# Altium footprint library HARTING THD.PcbLib: 113 footprints (part 4 of 11)
Each footprint in its own frame and in the unit in brackets; x right, y up, seen from the top. Pads: shape width x height; smd on the part's side, far side on the other; paste and mask are expansions set on the pad; w line width, h text height; cw(c..) or ccw(c..) is an arc to the next point about the centre after c.
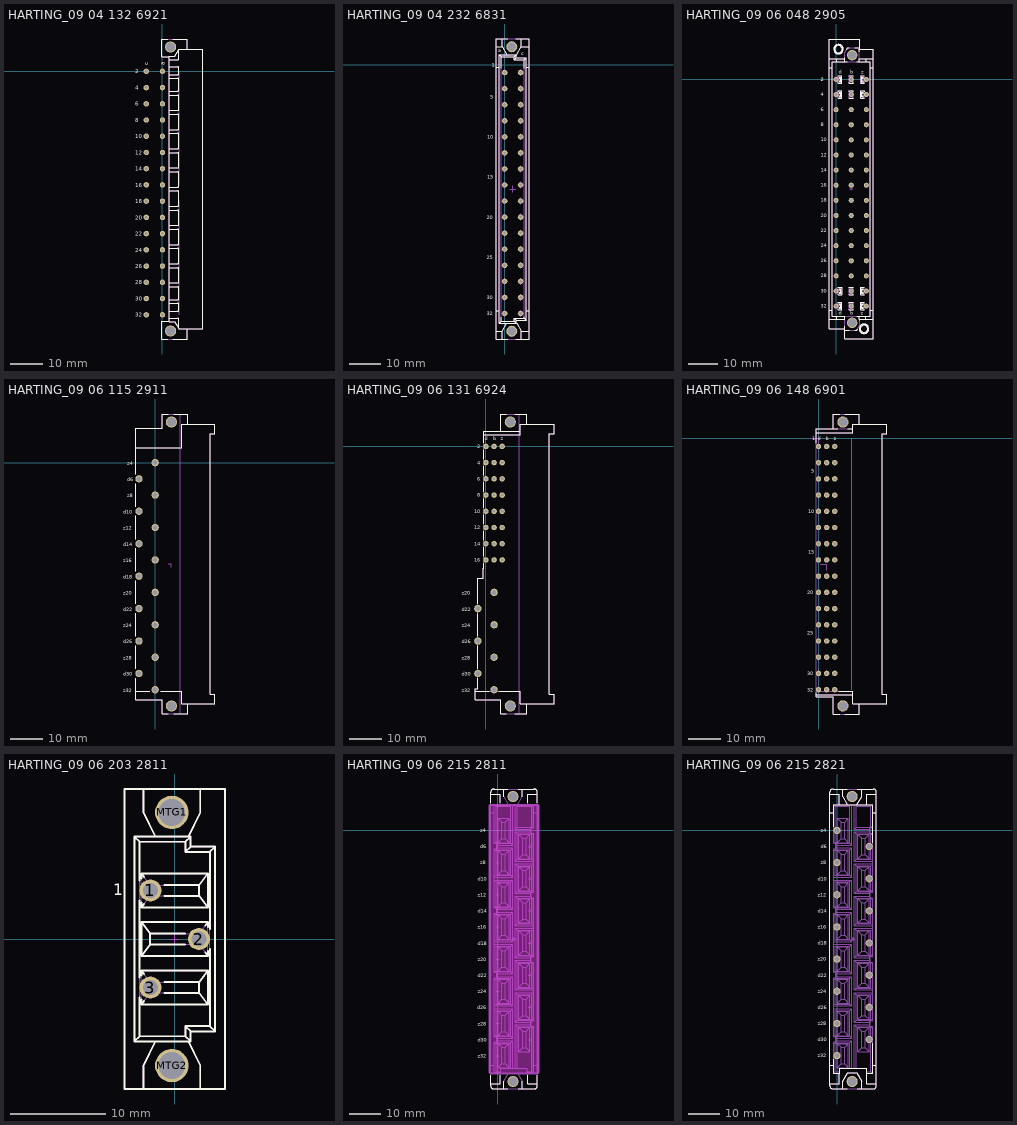
[diagram p3: the footprints below, top view; thin cyan lines are the x and y axes]

## HARTING_09 04 132 6921 [mm] "Eurocard DIN 41612, Type D, 32 Position, Rows a+c, Performance level 2, Male, Lead 3.0 mm, Pitch 5.08 mm"
height 11
pads (34):
  round 1.7 hole 1: a2(0,0) a4(0,-5.08) a6(0,-10.16) a8(0,-15.24) a10(0,-20.32) a12(0,-25.4) a14(0,-30.48) a16(0,-35.56) a18(0,-40.64) a20(0,-45.72) a22(0,-50.8) a24(0,-55.88) a26(0,-60.96) a28(0,-66.04) a30(0,-71.12) a32(0,-76.2) c2(-5.08,0) c4(-5.08,-5.08) c6(-5.08,-10.16) c8(-5.08,-15.24) c10(-5.08,-20.32) c12(-5.08,-25.4) c14(-5.08,-30.48) c16(-5.08,-35.56) c18(-5.08,-40.64) c20(-5.08,-45.72) c22(-5.08,-50.8) c24(-5.08,-55.88) c26(-5.08,-60.96) c28(-5.08,-66.04) c30(-5.08,-71.12) c32(-5.08,-76.2)
  round 3.5 / inner round 3.5 / far side round 5.1 hole 2.8: MTG1(2.54,7.62) MTG2(2.54,-81.28)
Top Overlay:
  lines w0.2: 1.65,-83.78 -0.31,-83.78 -0.31,-78.28 2.04,-78.28 ; 1.65,10.12 -0.31,10.12 -0.31,4.62 2.04,4.62 ; 2.04,-75.05 4.84,-75.05 ccw(c4.84,-74.85) 5.04,-74.85 5.04,-72.83 ccw(c4.84,-72.83) 4.84,-72.63 2.04,-72.63 ; 2.04,-71.43 4.84,-71.43 ccw(c4.84,-71.23) 5.04,-71.23 5.04,-67.63 ccw(c4.84,-67.63) 4.84,-67.43 2.04,-67.43 ; 2.04,-66.23 4.84,-66.23 ccw(c4.84,-66.03) 5.04,-66.03 5.04,-61.63 ccw(c4.84,-61.63) 4.84,-61.43 2.04,-61.43 ; 2.04,-60.23 4.84,-60.23 ccw(c4.84,-60.03) 5.04,-60.03 5.04,-55.63 ccw(c4.84,-55.63) 4.84,-55.43 2.04,-55.43 ; 2.04,-54.23 4.84,-54.23 ccw(c4.84,-54.03) 5.04,-54.03 5.04,-49.63 ccw(c4.84,-49.63) 4.84,-49.43 2.04,-49.43 ; 2.04,-48.23 4.84,-48.23 ccw(c4.84,-48.03) 5.04,-48.03 5.04,-43.63 ccw(c4.84,-43.63) 4.84,-43.43 2.04,-43.43 ; 2.04,-42.23 4.84,-42.23 ccw(c4.84,-42.03) 5.04,-42.03 5.04,-37.63 ccw(c4.84,-37.63) 4.84,-37.43 2.04,-37.43 ; 2.04,-36.23 4.84,-36.23 ccw(c4.84,-36.03) 5.04,-36.03 5.04,-31.63 ccw(c4.84,-31.63) 4.84,-31.43 2.04,-31.43 ; 2.04,-30.23 4.84,-30.23 ccw(c4.84,-30.03) 5.04,-30.03 5.04,-25.63 ccw(c4.84,-25.63) 4.84,-25.43 2.04,-25.43 ; 2.04,-24.23 4.84,-24.23 ccw(c4.84,-24.03) 5.04,-24.03 5.04,-19.63 ccw(c4.84,-19.63) 4.84,-19.43 2.04,-19.43 ; 2.04,-18.23 4.84,-18.23 ccw(c4.84,-18.03) 5.04,-18.03 5.04,-13.63 ccw(c4.84,-13.63) 4.84,-13.43 2.04,-13.43 ; 2.04,-12.23 4.84,-12.23 ccw(c4.84,-12.03) 5.04,-12.03 5.04,-7.63 ccw(c4.84,-7.63) 4.84,-7.43 2.04,-7.43 ; 2.04,-6.23 4.84,-6.23 ccw(c4.84,-6.03) 5.04,-6.03 5.04,-2.43 ccw(c4.84,-2.43) 4.84,-2.23 2.04,-2.23 ; 2.04,-1.03 4.84,-1.03 ccw(c4.84,-0.83) 5.04,-0.83 5.04,1.19 ccw(c4.84,1.19) 4.84,1.39 2.04,1.39 ; 2.04,3.69 4.84,3.69 ccw(c4.84,3.89) 5.04,3.89 5.04,6.75 ; 3.275,-83.78 7.74,-83.78 7.74,-80.53 ; 3.275,10.12 7.74,10.12 7.74,6.87 ; 2.04,-77.35 4.84,-77.35 cw(c4.84,-77.55) 5.04,-77.55 5.04,-80.41 ; 2.04,-77.35 2.04,-77.55 2.04,-78.43 3.897,-78.43 5.04,-80.41 ; 2.04,-77.35 2.04,4.77 3.897,4.77 5.04,6.75 ; 5.04,-80.41 5.109,-80.53 12.64,-80.53 12.64,6.87 5.109,6.87 5.04,6.75
  text "2" at -8.57,-0.675 h1.2
  text "4" at -8.57,-5.755 h1.2
  text "6" at -8.57,-10.835 h1.2
  text "8" at -8.57,-15.915 h1.2
  text "12" at -8.57,-26.075 h1.2
  text "14" at -8.57,-31.155 h1.2
  text "16" at -8.57,-36.235 h1.2
  text "18" at -8.57,-41.315 h1.2
  text "22" at -8.57,-51.475 h1.2
  text "24" at -8.57,-56.555 h1.2
  text "26" at -8.57,-61.635 h1.2
  text "c" at -4.445,1.905 h1.2
  text "a" at 0.635,1.905 h1.2
  text "32" at -8.57,-76.875 h1.2
  text "10" at -8.57,-20.995 h1.2
  text "20" at -8.57,-46.395 h1.2
  text "28" at -8.57,-66.715 h1.2
  text "30" at -8.57,-71.795 h1.2
Mechanical 8:
  lines w0.1: 5.3,-76.2 5.3,-40.475 ; 5.3,-35.725 5.3,0
  text "PCB" at 6.05,-40.1 h1.2
Mechanical 14:
  lines w0.1: 2.04,-78.28 -0.31,-78.28 -0.31,-83.78 7.74,-83.78 7.74,-80.53 ; 2.04,-75.05 4.84,-75.05 ccw(c4.84,-74.85) 5.04,-74.85 5.04,-72.83 ccw(c4.84,-72.83) 4.84,-72.63 2.04,-72.63 ; 2.04,-71.43 4.84,-71.43 ccw(c4.84,-71.23) 5.04,-71.23 5.04,-67.63 ccw(c4.84,-67.63) 4.84,-67.43 2.04,-67.43 ; 2.04,-66.23 4.84,-66.23 ccw(c4.84,-66.03) 5.04,-66.03 5.04,-61.63 ccw(c4.84,-61.63) 4.84,-61.43 2.04,-61.43 ; 2.04,-60.23 4.84,-60.23 ccw(c4.84,-60.03) 5.04,-60.03 5.04,-55.63 ccw(c4.84,-55.63) 4.84,-55.43 2.04,-55.43 ; 2.04,-54.23 4.84,-54.23 ccw(c4.84,-54.03) 5.04,-54.03 5.04,-49.63 ccw(c4.84,-49.63) 4.84,-49.43 2.04,-49.43 ; 2.04,-48.23 4.84,-48.23 ccw(c4.84,-48.03) 5.04,-48.03 5.04,-43.63 ccw(c4.84,-43.63) 4.84,-43.43 2.04,-43.43 ; 2.04,-42.23 4.84,-42.23 ccw(c4.84,-42.03) 5.04,-42.03 5.04,-37.63 ccw(c4.84,-37.63) 4.84,-37.43 2.04,-37.43 ; 2.04,-36.23 4.84,-36.23 ccw(c4.84,-36.03) 5.04,-36.03 5.04,-31.63 ccw(c4.84,-31.63) 4.84,-31.43 2.04,-31.43 ; 2.04,-30.23 4.84,-30.23 ccw(c4.84,-30.03) 5.04,-30.03 5.04,-25.63 ccw(c4.84,-25.63) 4.84,-25.43 2.04,-25.43 ; 2.04,-24.23 4.84,-24.23 ccw(c4.84,-24.03) 5.04,-24.03 5.04,-19.63 ccw(c4.84,-19.63) 4.84,-19.43 2.04,-19.43 ; 2.04,-18.23 4.84,-18.23 ccw(c4.84,-18.03) 5.04,-18.03 5.04,-13.63 ccw(c4.84,-13.63) 4.84,-13.43 2.04,-13.43 ; 2.04,-12.23 4.84,-12.23 ccw(c4.84,-12.03) 5.04,-12.03 5.04,-7.63 ccw(c4.84,-7.63) 4.84,-7.43 2.04,-7.43 ; 2.04,-6.23 4.84,-6.23 ccw(c4.84,-6.03) 5.04,-6.03 5.04,-2.43 ccw(c4.84,-2.43) 4.84,-2.23 2.04,-2.23 ; 2.04,-1.03 4.84,-1.03 ccw(c4.84,-0.83) 5.04,-0.83 5.04,1.19 ccw(c4.84,1.19) 4.84,1.39 2.04,1.39 ; 2.04,3.69 4.84,3.69 ccw(c4.84,3.89) 5.04,3.89 5.04,6.75 ; 2.04,4.62 -0.31,4.62 -0.31,10.12 7.74,10.12 7.74,6.87 ; 2.04,-77.35 2.04,4.77 3.897,4.77 5.04,6.75 ; 2.04,-77.35 2.04,-77.55 2.04,-78.43 3.897,-78.43 5.04,-80.41 ; 2.04,-77.35 4.84,-77.35 cw(c4.84,-77.55) 5.04,-77.55 5.04,-80.41 ; 5.04,-80.41 5.109,-80.53 12.64,-80.53 12.64,6.87 5.109,6.87 5.04,6.75
  text "a" at 0.635,1.905 h1.2
  text "c" at -4.445,1.905 h1.2
  text "30" at -8.57,-71.795 h1.2
  text "28" at -8.57,-66.715 h1.2
  text "20" at -8.57,-46.395 h1.2
  text "10" at -8.57,-20.995 h1.2
  text "32" at -8.57,-76.875 h1.2
  text "26" at -8.57,-61.635 h1.2
  text "24" at -8.57,-56.555 h1.2
  text "22" at -8.57,-51.475 h1.2
  text "18" at -8.57,-41.315 h1.2
  text "16" at -8.57,-36.235 h1.2
  text "14" at -8.57,-31.155 h1.2
  text "12" at -8.57,-26.075 h1.2
  text "8" at -8.57,-15.915 h1.2
  text "6" at -8.57,-10.835 h1.2
  text "4" at -8.57,-5.755 h1.2
  text "2" at -8.57,-0.675 h1.2
3D body "HARTING_09 04 132 6921.stp": height 9.4, standoff -3, extent -5.38,-83.83 12.64,10.17

## HARTING_09 04 232 6831 [mm] "DIN 41612, Type D, Thru-Hole; Rows a+c, 32 Position, Straight Female Backplane Connector"
height 11.6
pads (34):
  round 1.7 hole 1: a2(0,-2.54) a4(0,-7.62) a6(0,-12.7) a8(0,-17.78) a10(0,-22.86) a12(0,-27.94) a14(0,-33.02) a16(0,-38.1) a18(0,-43.18) a20(0,-48.26) a22(0,-53.34) a24(0,-58.42) a26(0,-63.5) a28(0,-68.58) a30(0,-73.66) a32(0,-78.74) c2(5.08,-2.54) c4(5.08,-7.62) c6(5.08,-12.7) c8(5.08,-17.78) c10(5.08,-22.86) c12(5.08,-27.94) c14(5.08,-33.02) c16(5.08,-38.1) c18(5.08,-43.18) c20(5.08,-48.26) c22(5.08,-53.34) c24(5.08,-58.42) c26(5.08,-63.5) c28(5.08,-68.58) c30(5.08,-73.66) c32(5.08,-78.74)
  round 3.5 / inner round 3.5 / far side round 5.1 hole 2.8: MTG1(2.24,5.63) MTG2(2.24,-84.37)
Top Overlay:
  lines w0.2: -2.71,-84.37 -0.735,-84.37 ; -2.71,-77.87 -1.71,-77.87 ; -2.71,-0.87 -1.71,-0.87 ; -2.71,5.63 -0.735,5.63 ; -1.06,-79.95 -1.06,-81.22 ; -1.06,-1.2 -1.06,2.48 ; -0.735,-86.82 -0.735,-84.37 ; -0.735,8.08 -0.735,5.63 ; 1,-86.82 -2.71,-86.82 -2.71,8.08 1,8.08 ; 3.556,-86.82 7.79,-86.82 7.79,8.08 3.556,8.08 ; 5.215,-86.82 5.215,-84.37 ; 5.215,8.08 5.215,5.63 ; 6.14,-79.75 6.14,-80.19 ; 6.14,-1.1 6.14,1.45 ; 6.79,-77.87 7.79,-77.87 ; 6.79,-0.87 7.79,-0.87 ; 7.79,-84.37 5.215,-84.37 ; 7.79,5.63 5.215,5.63 ; -1.71,-81.87 -1.06,-81.22 ; -1.71,-81.87 -1.71,3.13 ; -1.71,-81.87 3.69,-81.87 ; -1.71,3.13 -1.06,2.48 ; -1.71,3.13 3.69,3.13 ; -1.06,-81.22 3.04,-81.22 ; -1.06,2.48 3.04,2.48 ; -0.735,-84.37 0.708,-81.87 3.772,-81.87 5.215,-84.37 ; -0.735,5.63 0.708,3.13 3.772,3.13 5.215,5.63 ; 3.04,-81.22 3.69,-81.87 ; 3.04,-81.22 3.04,-80.19 ; 3.04,-80.19 3.69,-80.84 ; 3.04,-80.19 6.14,-80.19 ; 3.04,1.45 6.14,1.45 ; 3.04,1.45 3.69,2.1 ; 3.04,1.45 3.04,2.48 ; 3.04,2.48 3.69,3.13 ; 3.69,-81.87 3.69,-80.84 ; 3.69,-80.84 6.79,-80.84 ; 3.69,2.1 6.79,2.1 ; 3.69,2.1 3.69,3.13 ; 6.14,-80.19 6.79,-80.84 ; 6.14,1.45 6.79,2.1 ; 6.79,-80.84 6.79,2.1
  text "1" at -4.075,-0.675 h1.2
  text "15" at -5.475,-36.135 h1.2
  text "20" at -5.675,-48.885 h1.2
  text "25" at -5.675,-61.585 h1.2
  text "30" at -5.675,-74.285 h1.2
  text "5" at -4.55,-10.835 h1.2
  text "32" at -5.675,-79.365 h1.2
  text "10" at -5.475,-23.46 h1.2
  text "c" at 5.305,2.935 h1.2
  text "a" at -1.951,3.96 h1.2
Mechanical 8:
  lines w0.1: -1,-78.74 0,-78.74 ; -1,-73.66 0,-73.66 ; -1,-68.58 0,-68.58 ; -1,-63.5 0,-63.5 ; -1,-58.42 0,-58.42 ; -1,-53.34 0,-53.34 ; -1,-48.26 0,-48.26 ; -1,-43.18 0,-43.18 ; -1,-38.1 0,-38.1 ; -1,-33.02 0,-33.02 ; -1,-27.94 0,-27.94 ; -1,-22.86 0,-22.86 ; -1,-17.78 0,-17.78 ; -1,-12.7 0,-12.7 ; -1,-7.62 0,-7.62 ; -1,-2.54 0,-2.54 ; 0,-79.74 0,-78.74 ; 0,-77.74 0,-78.74 ; 0,-74.66 0,-73.66 ; 0,-72.66 0,-73.66 ; 0,-69.58 0,-68.58 ; 0,-67.58 0,-68.58 ; 0,-64.5 0,-63.5 ; 0,-62.5 0,-63.5 ; 0,-59.42 0,-58.42 ; 0,-57.42 0,-58.42 ; 0,-54.34 0,-53.34 ; 0,-52.34 0,-53.34 ; 0,-49.26 0,-48.26 ; 0,-47.26 0,-48.26 ; 0,-44.18 0,-43.18 ; 0,-42.18 0,-43.18 ; 0,-39.1 0,-38.1 ; 0,-37.1 0,-38.1 ; 0,-34.02 0,-33.02 ; 0,-32.02 0,-33.02 ; 0,-28.94 0,-27.94 ; 0,-26.94 0,-27.94 ; 0,-23.86 0,-22.86 ; 0,-21.86 0,-22.86 ; 0,-18.78 0,-17.78 ; 0,-16.78 0,-17.78 ; 0,-13.7 0,-12.7 ; 0,-11.7 0,-12.7 ; 0,-8.62 0,-7.62 ; 0,-6.62 0,-7.62 ; 0,-3.54 0,-2.54 ; 0,-1.54 0,-2.54 ; 1,-78.74 0,-78.74 ; 1,-73.66 0,-73.66 ; 1,-68.58 0,-68.58 ; 1,-63.5 0,-63.5 ; 1,-58.42 0,-58.42 ; 1,-53.34 0,-53.34 ; 1,-48.26 0,-48.26 ; 1,-43.18 0,-43.18 ; 1,-38.1 0,-38.1 ; 1,-33.02 0,-33.02 ; 1,-27.94 0,-27.94 ; 1,-22.86 0,-22.86 ; 1,-17.78 0,-17.78 ; 1,-12.7 0,-12.7 ; 1,-7.62 0,-7.62 ; 1,-2.54 0,-2.54 ; 1.24,-84.37 2.24,-84.37 ; 1.24,5.63 2.24,5.63 ; 1.54,-39.37 2.54,-39.37 ; 2.24,-85.37 2.24,-84.37 ; 2.24,-83.37 2.24,-84.37 ; 2.24,4.63 2.24,5.63 ; 2.24,6.63 2.24,5.63 ; 2.54,-40.37 2.54,-39.37 ; 2.54,-38.37 2.54,-39.37 ; 3.24,-84.37 2.24,-84.37 ; 3.24,5.63 2.24,5.63 ; 3.54,-39.37 2.54,-39.37 ; 4.08,-78.74 5.08,-78.74 ; 4.08,-73.66 5.08,-73.66 ; 4.08,-68.58 5.08,-68.58 ; 4.08,-63.5 5.08,-63.5 ; 4.08,-58.42 5.08,-58.42 ; 4.08,-53.34 5.08,-53.34 ; 4.08,-48.26 5.08,-48.26 ; 4.08,-43.18 5.08,-43.18 ; 4.08,-38.1 5.08,-38.1 ; 4.08,-33.02 5.08,-33.02 ; 4.08,-27.94 5.08,-27.94 ; 4.08,-22.86 5.08,-22.86 ; 4.08,-17.78 5.08,-17.78 ; 4.08,-12.7 5.08,-12.7 ; 4.08,-7.62 5.08,-7.62 ; 4.08,-2.54 5.08,-2.54 ; 5.08,-79.74 5.08,-78.74 ; 5.08,-77.74 5.08,-78.74 ; 5.08,-74.66 5.08,-73.66 ; 5.08,-72.66 5.08,-73.66 ; 5.08,-69.58 5.08,-68.58 ; 5.08,-67.58 5.08,-68.58 ; 5.08,-64.5 5.08,-63.5 ; 5.08,-62.5 5.08,-63.5 ; 5.08,-59.42 5.08,-58.42 ; 5.08,-57.42 5.08,-58.42 ; 5.08,-54.34 5.08,-53.34 ; 5.08,-52.34 5.08,-53.34 ; 5.08,-49.26 5.08,-48.26 ; 5.08,-47.26 5.08,-48.26 ; 5.08,-44.18 5.08,-43.18 ; 5.08,-42.18 5.08,-43.18 ; 5.08,-39.1 5.08,-38.1 ; 5.08,-37.1 5.08,-38.1 ; 5.08,-34.02 5.08,-33.02 ; 5.08,-32.02 5.08,-33.02 ; 5.08,-28.94 5.08,-27.94 ; 5.08,-26.94 5.08,-27.94 ; 5.08,-23.86 5.08,-22.86 ; 5.08,-21.86 5.08,-22.86 ; 5.08,-18.78 5.08,-17.78 ; 5.08,-16.78 5.08,-17.78 ; 5.08,-13.7 5.08,-12.7 ; 5.08,-11.7 5.08,-12.7 ; 5.08,-8.62 5.08,-7.62 ; 5.08,-6.62 5.08,-7.62 ; 5.08,-3.54 5.08,-2.54 ; 5.08,-1.54 5.08,-2.54 ; 6.08,-78.74 5.08,-78.74 ; 6.08,-73.66 5.08,-73.66 ; 6.08,-68.58 5.08,-68.58 ; 6.08,-63.5 5.08,-63.5 ; 6.08,-58.42 5.08,-58.42 ; 6.08,-53.34 5.08,-53.34 ; 6.08,-48.26 5.08,-48.26 ; 6.08,-43.18 5.08,-43.18 ; 6.08,-38.1 5.08,-38.1 ; 6.08,-33.02 5.08,-33.02 ; 6.08,-27.94 5.08,-27.94 ; 6.08,-22.86 5.08,-22.86 ; 6.08,-17.78 5.08,-17.78 ; 6.08,-12.7 5.08,-12.7 ; 6.08,-7.62 5.08,-7.62 ; 6.08,-2.54 5.08,-2.54
Mechanical 14:
  circle w0.1: c2.24,-84.37 r1.425
  circle w0.1: c2.24,5.63 r1.425
  lines w0.1: -2.71,-84.37 -0.735,-84.37 ; -2.71,-77.87 -1.71,-77.87 ; -2.71,-0.87 -1.71,-0.87 ; -0.735,-86.82 -0.735,-84.37 ; -0.735,8.08 -0.735,5.63 0.708,3.13 3.772,3.13 5.215,5.63 ; -0.3,2.925 1.675,2.925 ; 5.215,-86.82 5.215,-84.37 ; 5.215,8.08 5.215,5.63 ; 6.79,-77.87 7.79,-77.87 ; 6.79,-0.87 7.79,-0.87 ; 7.79,-84.37 5.215,-84.37 ; 7.79,5.63 5.215,5.63 ; -1.71,-81.87 -1.06,-81.22 ; -1.71,-81.87 -1.71,3.13 ; -1.71,-81.87 3.69,-81.87 ; -1.71,3.13 -1.06,2.48 ; -1.71,3.13 3.69,3.13 ; -1.06,-81.22 -1.06,2.48 ; -1.06,-81.22 3.04,-81.22 ; -1.06,2.48 3.04,2.48 ; -0.735,-84.37 0.708,-81.87 3.772,-81.87 5.215,-84.37 ; 3.04,-81.22 3.69,-81.87 ; 3.04,-81.22 3.04,-80.19 ; 3.04,-80.19 3.69,-80.84 ; 3.04,-80.19 6.14,-80.19 ; 3.04,1.45 6.14,1.45 ; 3.04,1.45 3.69,2.1 ; 3.04,1.45 3.04,2.48 ; 3.04,2.48 3.69,3.13 ; 3.69,-81.87 3.69,-80.84 ; 3.69,-80.84 6.79,-80.84 ; 3.69,2.1 6.79,2.1 ; 3.69,2.1 3.69,3.13 ; 6.14,-80.19 6.79,-80.84 ; 6.14,-80.19 6.14,1.45 ; 6.14,1.45 6.79,2.1 ; 6.79,-80.84 6.79,2.1 ; -2.71,-86.82 -2.71,8.08 7.79,8.08 7.79,-86.82 -2.71,-86.82
  text "1" at -4.075,-0.675 h1.2
  text "15" at -5.475,-36.135 h1.2
  text "20" at -5.675,-48.885 h1.2
  text "25" at -5.675,-61.585 h1.2
  text "30" at -5.675,-74.285 h1.2
  text "5" at -4.55,-10.835 h1.2
  text "32" at -5.675,-79.365 h1.2
  text "10" at -5.475,-23.46 h1.2
  text "c" at 5.305,2.935 h1.2
  text "a" at -1.951,3.96 h1.2
3D body "HARTING_09 04 232 6831.stp": height 11.6, standoff -4.5, extent -2.71,-86.82 7.79,8.08

## HARTING_09 06 048 2905 [mm] "DIN 41612, Type F. 48 Contacts, Rows z+b+d, Performance Level 1, Straight Male Connector"
height 18
pads (50):
  round 1.7 hole 1: b2(5.08,0) b4(5.08,-5.08) b6(5.08,-10.16) b8(5.08,-15.24) b10(5.08,-20.32) b12(5.08,-25.4) b14(5.08,-30.48) b16(5.08,-35.56) b18(5.08,-40.64) b20(5.08,-45.72) b22(5.08,-50.8) b24(5.08,-55.88) b26(5.08,-60.96) b28(5.08,-66.04) b30(5.08,-71.12) b32(5.08,-76.2) d2(0,0) d4(0,-5.08) d6(0,-10.16) d8(0,-15.24) d10(0,-20.32) d12(0,-25.4) d14(0,-30.48) d16(0,-35.56) d18(0,-40.64) d20(0,-45.72) d22(0,-50.8) d24(0,-55.88) d26(0,-60.96) d28(0,-66.04) d30(0,-71.12) d32(0,-76.2) z2(10.16,0) z4(10.16,-5.08) z6(10.16,-10.16) z8(10.16,-15.24) z10(10.16,-20.32) z12(10.16,-25.4) z14(10.16,-30.48) z16(10.16,-35.56) z18(10.16,-40.64) z20(10.16,-45.72) z22(10.16,-50.8) z24(10.16,-55.88) z26(10.16,-60.96) z28(10.16,-66.04) z30(10.16,-71.12) z32(10.16,-76.2)
  round 3.5 / inner round 3.5 / far side round 5.1 hole 2.8: MTG1(5.38,-81.83) MTG1(5.38,8.17)
Top Overlay:
  drawing of 172 lines, arcs and shapes, not listed
  text "d" at 0.952,1.905 h1.2
  text "z" at 8.417,1.905 h1.2
  text "b" at 4.763,1.905 h1.2
  text "2" at -5.125,-0.525 h1.2
  text "2" at -5.125,-0.525 h1.2
  text "4" at -5.125,-5.605 h1.2
  text "6" at -5.125,-10.685 h1.2
  text "8" at -5.125,-15.765 h1.2
  text "10" at -5.125,-20.845 h1.2
  text "12" at -5.125,-25.925 h1.2
  text "14" at -5.125,-31.005 h1.2
  text "16" at -5.125,-36.085 h1.2
  text "18" at -5.125,-41.165 h1.2
  text "20" at -5.125,-46.245 h1.2
  text "22" at -5.125,-51.325 h1.2
  text "24" at -5.125,-56.405 h1.2
  text "26" at -5.125,-61.485 h1.2
  text "28" at -5.125,-66.565 h1.2
  text "30" at -5.125,-71.645 h1.2
  text "32" at -5.125,-76.725 h1.2
  text "b" at 4.7,-79.1 h1.2
  text "z" at 8.355,-79.1 h1.2
  text "d" at 0.89,-79.1 h1.2
Mechanical 8:
  drawing of 254 lines, arcs and shapes, not listed
Mechanical 14:
  drawing of 232 lines, arcs and shapes, not listed
  text "d" at 0.952,1.905 h1.2
  text "z" at 8.417,1.905 h1.2
  text "b" at 4.763,1.905 h1.2
  text "2" at -5.125,-0.525 h1.2
  text "2" at -5.125,-0.525 h1.2
  text "4" at -5.125,-5.605 h1.2
  text "6" at -5.125,-10.685 h1.2
  text "8" at -5.125,-15.765 h1.2
  text "10" at -5.125,-20.845 h1.2
  text "12" at -5.125,-25.925 h1.2
  text "14" at -5.125,-31.005 h1.2
  text "16" at -5.125,-36.085 h1.2
  text "18" at -5.125,-41.165 h1.2
  text "20" at -5.125,-46.245 h1.2
  text "22" at -5.125,-51.325 h1.2
  text "24" at -5.125,-56.405 h1.2
  text "26" at -5.125,-61.485 h1.2
  text "28" at -5.125,-66.565 h1.2
  text "30" at -5.125,-71.645 h1.2
  text "32" at -5.125,-76.725 h1.2
  text "b" at 4.7,-79.1 h1.2
  text "z" at 8.355,-79.1 h1.2
  text "d" at 0.89,-79.1 h1.2
3D body "HARTING_09 06 048 2905.stp": height 18, standoff -3.7, extent -2.27,-87.255 12.43,13.595

## HARTING_09 06 115 2911 [mm] "DIN 41612, Type H, 15 Poles, Rows z+d, Performance level 1, Right Angle Male Connector, Lead 3.0 mm, Pitch 5.08mm"
height 11
pads (17):
  round 2.3 hole 1.6: d6(-5.08,-5.08) d10(-5.08,-15.24) d14(-5.08,-25.4) d18(-5.08,-35.56) d22(-5.08,-45.72) d26(-5.08,-55.88) d30(-5.08,-66.04) z4(0,0) z8(0,-10.16) z12(0,-20.32) z16(0,-30.48) z20(0,-40.64) z24(0,-50.8) z28(0,-60.96) z32(0,-71.12)
  round 3.5 / inner round 3.5 / far side round 5.1 hole 2.8: MTG1(5.08,12.7) MTG2(5.08,-76.2)
Top Overlay:
  lines w0.2: -6.02,-71.55 -1.696,-71.55 ; -6.02,-67.516 -6.02,-74.3 2.18,-74.3 2.18,-78.725 4.14,-78.725 ; -6.02,-64.564 -6.02,-57.356 ; -6.02,-54.404 -6.02,-47.196 ; -6.02,-44.244 -6.02,-37.036 ; -6.02,-34.084 -6.02,-26.876 ; -6.02,-23.924 -6.02,-16.716 ; -6.02,-13.764 -6.02,-6.556 ; -6.02,-3.604 -6.02,10.8 2.18,10.8 2.18,15.225 4.14,15.225 ; -6.02,4.67 8.38,4.67 8.38,11.95 18.73,11.95 18.73,9.05 17.21,9.05 17.21,-72.55 18.73,-72.55 18.73,-75.45 8.38,-75.45 8.38,-71.55 1.696,-71.55 ; 5.765,-78.725 10.23,-78.725 10.23,-75.45 ; 5.765,15.225 10.23,15.225 10.23,11.95
  text "z32" at -10.07,-71.87 h1.2
  text "z28" at -10.07,-61.71 h1.2
  text "d30" at -10.07,-66.79 h1.2
  text "z24" at -10.07,-51.55 h1.2
  text "d26" at -10.07,-56.63 h1.2
  text "z20" at -10.07,-41.39 h1.2
  text "d22" at -10.07,-46.47 h1.2
  text "z16" at -10.07,-31.23 h1.2
  text "d18" at -10.07,-36.31 h1.2
  text "z12" at -10.07,-21.07 h1.2
  text "d14" at -10.07,-26.15 h1.2
  text "z8" at -8.8,-10.91 h1.2
  text "d10" at -10.07,-15.99 h1.2
  text "d6" at -8.8,-5.83 h1.2
  text "z4" at -8.8,-0.75 h1.2
Mechanical 8:
  lines w0.2: 4.064,-31.75 5.08,-31.75 5.08,-32.75 ; 7.84,-78.725 7.84,15.225
  text "PCB" at 6.985,-33.655 h1.2
Mechanical 14:
  lines w0.1: -6.02,-71.55 -1.696,-71.55 ; -6.02,-67.516 -6.02,-74.3 2.18,-74.3 2.18,-78.725 10.23,-78.725 10.23,-75.45 ; -6.02,-64.564 -6.02,-57.356 ; -6.02,-54.404 -6.02,-47.196 ; -6.02,-44.244 -6.02,-37.036 ; -6.02,-34.084 -6.02,-26.876 ; -6.02,-23.924 -6.02,-16.716 ; -6.02,-13.764 -6.02,-6.556 ; -6.02,-3.604 -6.02,10.8 2.18,10.8 2.18,15.225 10.23,15.225 10.23,11.95 ; -6.02,4.67 8.38,4.67 8.38,11.95 18.73,11.95 18.73,9.05 17.21,9.05 17.21,-72.55 18.73,-72.55 18.73,-75.45 8.38,-75.45 8.38,-71.55 1.696,-71.55
  text "z32" at -10.07,-71.87 h1.2
  text "z28" at -10.07,-61.71 h1.2
  text "d30" at -10.07,-66.79 h1.2
  text "z24" at -10.07,-51.55 h1.2
  text "d26" at -10.07,-56.63 h1.2
  text "z20" at -10.07,-41.39 h1.2
  text "d22" at -10.07,-46.47 h1.2
  text "z16" at -10.07,-31.23 h1.2
  text "d18" at -10.07,-36.31 h1.2
  text "z12" at -10.07,-21.07 h1.2
  text "d14" at -10.07,-26.15 h1.2
  text "z8" at -8.8,-10.91 h1.2
  text "d10" at -10.07,-15.99 h1.2
  text "d6" at -8.8,-5.83 h1.2
  text "z4" at -8.8,-0.75 h1.2
3D body "HARTING_09 06 115 2911.stp": height 11.2, standoff -3.5, extent -6.02,-78.725 18.73,15.225

## HARTING_09 06 131 6924 [mm] "DIN 41612, Type MH, 24+ 7 Contacts, Rows z+b+d, Performance level 2, Right Angled Male Connector"
height 11.22
pads (33):
  round 1.7 hole 1: b2(2.54,0) b4(2.54,-5.08) b6(2.54,-10.16) b8(2.54,-15.24) b10(2.54,-20.32) b12(2.54,-25.4) b14(2.54,-30.48) b16(2.54,-35.56) d2(0,0) d4(0,-5.08) d6(0,-10.16) d8(0,-15.24) d10(0,-20.32) d12(0,-25.4) d14(0,-30.48) d16(0,-35.56) z2(5.08,0) z4(5.08,-5.08) z6(5.08,-10.16) z8(5.08,-15.24) z10(5.08,-20.32) z12(5.08,-25.4) z14(5.08,-30.48) z16(5.08,-35.56)
  round 2.3 hole 1.6: d22(-2.54,-50.8) d26(-2.54,-60.96) d30(-2.54,-71.12) z20(2.54,-45.72) z24(2.54,-55.88) z28(2.54,-66.04) z32(2.54,-76.2)
  round 3.5 / inner round 3.5 / far side round 5.1 hole 2.8: MTG1(7.62,7.62) MTG2(7.62,-81.28)
Top Overlay:
  lines w0.2: -3.43,-76.63 1.051,-76.63 ; -2.63,-72.667 -2.63,-75.83 -3.43,-75.83 -3.43,-79.36 4.67,-79.36 4.67,-83.805 6.325,-83.805 ; -2.63,-69.573 -2.63,-62.507 ; -2.63,-59.413 -2.63,-52.347 ; -2.63,-49.253 -2.63,-41.345 -0.83,-41.345 -0.83,-38.1 -0.68,-38.1 -0.68,-36.668 ; -0.68,-34.452 -0.68,-31.588 ; -0.68,-29.372 -0.68,-26.508 ; -0.68,-24.292 -0.68,-21.428 ; -0.68,-19.212 -0.68,-16.348 ; -0.68,-14.132 -0.68,-11.268 ; -0.68,-9.052 -0.68,-6.188 ; -0.68,-3.972 -0.68,-1.108 ; -0.68,1.108 -0.68,4.79 10.77,4.79 ; -0.68,3.62 10.77,3.62 10.77,6.87 21.32,6.87 21.32,3.97 19.82,3.97 19.82,-77.63 21.32,-77.63 21.32,-80.53 10.77,-80.53 ; 4.029,-76.63 10.77,-76.63 ; 4.67,4.79 4.67,10.145 6.325,10.145 ; 9.025,-83.805 12.77,-83.805 12.77,-80.53 ; 9.025,10.145 12.77,10.145 12.77,6.87 ; 10.77,-80.53 10.77,-76.63 ; 10.77,-80.53 10.77,-76.63
  text "d22" at -7.53,-51.55 h1.2
  text "z20" at -7.53,-46.47 h1.2
  text "d26" at -7.53,-61.71 h1.2
  text "z24" at -7.53,-56.63 h1.2
  text "d30" at -7.53,-71.87 h1.2
  text "z28" at -7.53,-66.79 h1.2
  text "z32" at -7.53,-76.95 h1.2
  text "b" at 2.223,1.905 h1.2
  text "2" at -2.765,-0.543 h1.2
  text "4" at -2.79,-5.685 h1.2
  text "z" at 4.608,1.905 h1.2
  text "d" at -0.318,1.905 h1.2
  text "6" at -2.79,-10.765 h1.2
  text "8" at -2.79,-15.845 h1.2
  text "10" at -3.74,-20.925 h1.2
  text "12" at -3.74,-26.005 h1.2
  text "14" at -3.74,-31.085 h1.2
  text "16" at -3.74,-36.165 h1.2
Mechanical 8:
  lines w0.1: -3.04,-71.12 -2.54,-71.12 ; -3.04,-60.96 -2.54,-60.96 ; -3.04,-50.8 -2.54,-50.8 ; -2.54,-71.62 -2.54,-71.12 ; -2.54,-70.62 -2.54,-71.12 ; -2.54,-61.46 -2.54,-60.96 ; -2.54,-60.46 -2.54,-60.96 ; -2.54,-51.3 -2.54,-50.8 ; -2.54,-50.3 -2.54,-50.8 ; -2.04,-71.12 -2.54,-71.12 ; -2.04,-60.96 -2.54,-60.96 ; -2.04,-50.8 -2.54,-50.8 ; -0.5,-35.56 0,-35.56 ; -0.5,-30.48 0,-30.48 ; -0.5,-25.4 0,-25.4 ; -0.5,-20.32 0,-20.32 ; -0.5,-15.24 0,-15.24 ; -0.5,-10.16 0,-10.16 ; -0.5,-5.08 0,-5.08 ; 0,-36.06 0,-35.56 ; 0,-35.06 0,-35.56 ; 0,-30.98 0,-30.48 ; 0,-29.98 0,-30.48 ; 0,-25.9 0,-25.4 ; 0,-24.9 0,-25.4 ; 0,-20.82 0,-20.32 ; 0,-19.82 0,-20.32 ; 0,-15.74 0,-15.24 ; 0,-14.74 0,-15.24 ; 0,-10.66 0,-10.16 ; 0,-9.66 0,-10.16 ; 0,-5.58 0,-5.08 ; 0,-4.58 0,-5.08 ; 0.5,-35.56 0,-35.56 ; 0.5,-30.48 0,-30.48 ; 0.5,-25.4 0,-25.4 ; 0.5,-20.32 0,-20.32 ; 0.5,-15.24 0,-15.24 ; 0.5,-10.16 0,-10.16 ; 0.5,-5.08 0,-5.08 ; 2.04,-76.2 2.54,-76.2 ; 2.04,-66.04 2.54,-66.04 ; 2.04,-55.88 2.54,-55.88 ; 2.04,-45.72 2.54,-45.72 ; 2.04,-35.56 2.54,-35.56 ; 2.04,-30.48 2.54,-30.48 ; 2.04,-25.4 2.54,-25.4 ; 2.04,-20.32 2.54,-20.32 ; 2.04,-15.24 2.54,-15.24 ; 2.04,-10.16 2.54,-10.16 ; 2.04,-5.08 2.54,-5.08 ; 2.04,0 2.54,0 ; 2.54,-76.7 2.54,-76.2 ; 2.54,-75.7 2.54,-76.2 ; 2.54,-66.54 2.54,-66.04 ; 2.54,-65.54 2.54,-66.04 ; 2.54,-56.38 2.54,-55.88 ; 2.54,-55.38 2.54,-55.88 ; 2.54,-46.22 2.54,-45.72 ; 2.54,-45.22 2.54,-45.72 ; 2.54,-36.06 2.54,-35.56 ; 2.54,-35.06 2.54,-35.56 ; 2.54,-30.98 2.54,-30.48 ; 2.54,-29.98 2.54,-30.48 ; 2.54,-25.9 2.54,-25.4 ; 2.54,-24.9 2.54,-25.4 ; 2.54,-20.82 2.54,-20.32 ; 2.54,-19.82 2.54,-20.32 ; 2.54,-15.74 2.54,-15.24 ; 2.54,-14.74 2.54,-15.24 ; 2.54,-10.66 2.54,-10.16 ; 2.54,-9.66 2.54,-10.16 ; 2.54,-5.58 2.54,-5.08 ; 2.54,-4.58 2.54,-5.08 ; 2.54,-0.5 2.54,0 ; 2.54,0.5 2.54,0 ; 3.04,-76.2 2.54,-76.2 ; 3.04,-66.04 2.54,-66.04 ; 3.04,-55.88 2.54,-55.88 ; 3.04,-45.72 2.54,-45.72 ; 3.04,-35.56 2.54,-35.56 ; 3.04,-30.48 2.54,-30.48 ; 3.04,-25.4 2.54,-25.4 ; 3.04,-20.32 2.54,-20.32 ; 3.04,-15.24 2.54,-15.24 ; 3.04,-10.16 2.54,-10.16 ; 3.04,-5.08 2.54,-5.08 ; 3.04,0 2.54,0 ; 4.58,-35.56 5.08,-35.56 ; 4.58,-30.48 5.08,-30.48 ; 4.58,-25.4 5.08,-25.4 ; 4.58,-20.32 5.08,-20.32 ; 4.58,-15.24 5.08,-15.24 ; 4.58,-10.16 5.08,-10.16 ; 4.58,-5.08 5.08,-5.08 ; 4.58,0 5.08,0 ; 5.08,-36.06 5.08,-35.56 ; 5.08,-35.06 5.08,-35.56 ; 5.08,-30.98 5.08,-30.48 ; 5.08,-29.98 5.08,-30.48 ; 5.08,-25.9 5.08,-25.4 ; 5.08,-24.9 5.08,-25.4 ; 5.08,-20.82 5.08,-20.32 ; 5.08,-19.82 5.08,-20.32 ; 5.08,-15.74 5.08,-15.24 ; 5.08,-14.74 5.08,-15.24 ; 5.08,-10.66 5.08,-10.16 ; 5.08,-9.66 5.08,-10.16 ; 5.08,-5.58 5.08,-5.08 ; 5.08,-4.58 5.08,-5.08 ; 5.08,-0.5 5.08,0 ; 5.08,0.5 5.08,0 ; 5.58,-35.56 5.08,-35.56 ; 5.58,-30.48 5.08,-30.48 ; 5.58,-25.4 5.08,-25.4 ; 5.58,-20.32 5.08,-20.32 ; 5.58,-15.24 5.08,-15.24 ; 5.58,-10.16 5.08,-10.16 ; 5.58,-5.08 5.08,-5.08 ; 5.58,0 5.08,0 ; 7.12,-81.28 7.62,-81.28 ; 7.12,7.62 7.62,7.62 ; 7.62,-81.78 7.62,-81.28 ; 7.62,-80.78 7.62,-81.28 ; 7.62,7.12 7.62,7.62 ; 7.62,8.12 7.62,7.62 ; 8.12,-81.28 7.62,-81.28 ; 8.12,7.62 7.62,7.62 ; 10.38,-83.805 10.38,-36.83 10.38,10.145 ; 0,0 0,-0.5 0,0 ; 0,0 -0.5,0 0,0 ; 0,0 0,0.5 0,0 ; 0,0 0.5,0 0,0